# Altium footprint library TranDangKhoa-LIB.PcbLib: 1435 footprints (part 54 of 90)
Each footprint in its own frame and in the unit in brackets; x right, y up, seen from the top. Pads: shape width x height; smd on the part's side, far side on the other; paste and mask are expansions set on the pad; w line width, h text height; cw(c..) or ccw(c..) is an arc to the next point about the centre after c.
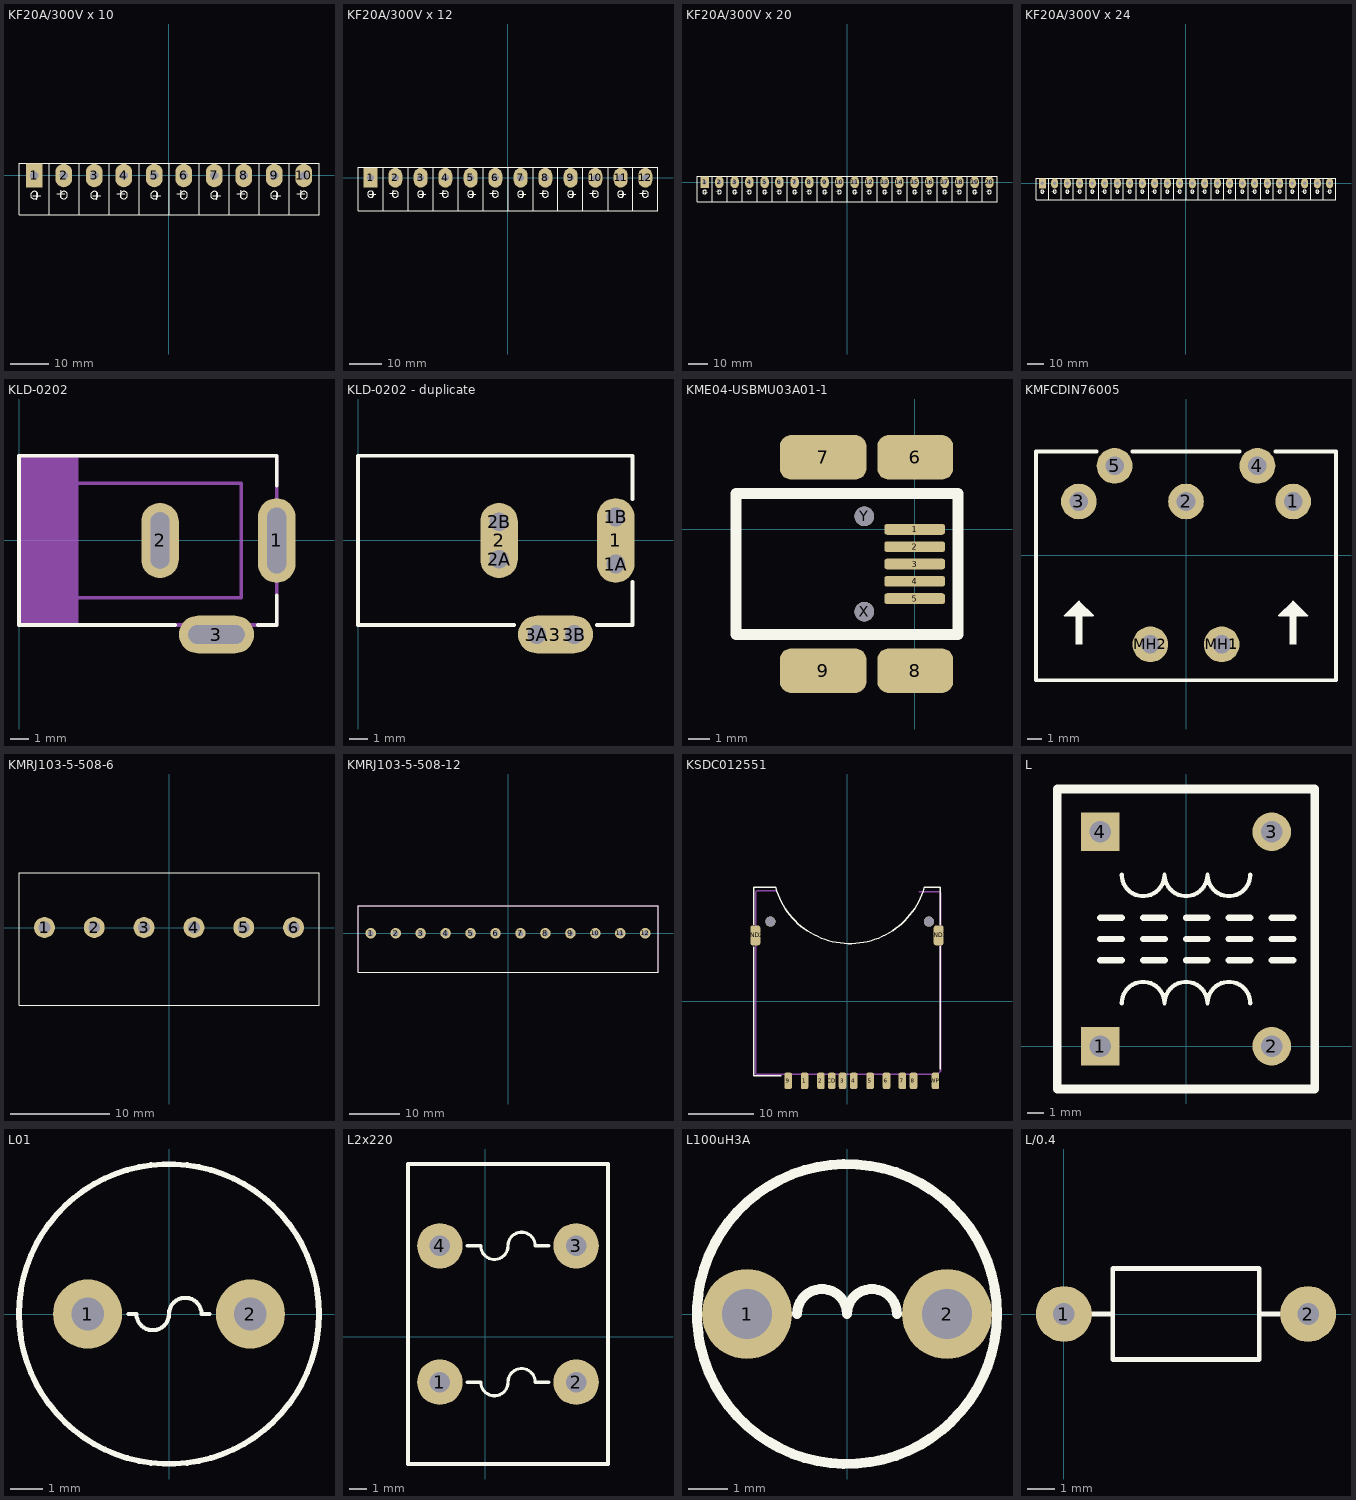
[diagram p53: the footprints below, top view; thin cyan lines are the x and y axes]

## KF20A/300V x 10 [mil] "Jac nguon 220V 20A XANH"
height 216.54
pads (10):
  rect 170x240 hole 85: 1(-1370.47,0)
  oval 170x240 hole 85: 2(-1070.47,0) 3(-760.24,0) 4(-460.24,0) 5(-150,0) 6(150,0) 7(460.24,0) 8(760.24,0) 9(1070.47,0) 10(1370.47,0)
Top Overlay:
  circle w8: c-1070.47,-200 r38.08
  circle w8: c-1370.47,-200 r38.08
  circle w8: c-760.24,-200 r38.08
  circle w8: c-460.24,-200 r38.08
  circle w8: c150,-200 r38.08
  circle w8: c-150,-200 r38.08
  circle w8: c760.24,-200 r38.08
  circle w8: c460.24,-200 r38.08
  circle w8: c1370.47,-200 r38.08
  circle w8: c1070.47,-200 r38.08
  lines w10: -1220.47,-400 -1220.47,125 ; -610.24,-400 -610.24,125 ; 0,-400 0,125 ; 610.24,-400 610.24,125 ; 1220.47,-400 1220.47,125
  lines w11.81: -915.35,-400 -1525.59,-400 -1525.59,125 -915.35,125 ; -915.35,-400 -915.35,125 ; -915.35,-400 -915.35,125 ; -915.35,-400 -305.12,-400 ; -915.35,125 -305.12,125 ; -305.12,-400 -305.12,125 ; -305.12,-400 305.12,-400 ; -305.12,-400 -305.12,125 ; -305.12,125 305.12,125 ; 305.12,-400 305.12,125 ; 305.12,-400 915.35,-400 ; 305.12,-400 305.12,125 ; 305.12,125 915.35,125 ; 915.35,-400 915.35,125 ; 915.35,-400 1525.59,-400 ; 915.35,-400 915.35,125 ; 915.35,125 1525.59,125 ; 1525.59,-400 1525.59,125 ; 1525.59,-400 1525.59,125
  text "+" at -1037.47,-150 h100
  text "+" at -1403.47,-250 h100
  text "+" at -793.24,-250 h100
  text "+" at -427.24,-150 h100
  text "+" at 183,-150 h100
  text "+" at -183,-250 h100
  text "+" at 793.24,-150 h100
  text "+" at 427.24,-250 h100
  text "+" at 1403.47,-150 h100
  text "+" at 1037.47,-250 h100

## KF20A/300V x 12 [mil] "Jac nguon 220V 20A XANH"
height 216.54
pads (12):
  rect 170x240 hole 85: 1(-1675.59,0)
  oval 170x240 hole 85: 2(-1375.59,0) 3(-1065.35,0) 4(-765.35,0) 5(-455.12,0) 6(-155.12,0) 7(155.12,0) 8(455.12,0) 9(765.35,0) 10(1065.35,0) 11(1375.59,0) 12(1675.59,0)
Top Overlay:
  circle w8: c-1375.59,-200 r38.08
  circle w8: c-1675.59,-200 r38.08
  circle w8: c-1065.35,-200 r38.08
  circle w8: c-765.35,-200 r38.08
  circle w8: c-155.12,-200 r38.08
  circle w8: c-455.12,-200 r38.08
  circle w8: c455.12,-200 r38.08
  circle w8: c155.12,-200 r38.08
  circle w8: c1065.35,-200 r38.08
  circle w8: c765.35,-200 r38.08
  circle w8: c1675.59,-200 r38.08
  circle w8: c1375.59,-200 r38.08
  lines w10: -1525.59,-400 -1525.59,125 ; -915.35,-400 -915.35,125 ; -305.12,-400 -305.12,125 ; 305.12,-400 305.12,125 ; 915.35,-400 915.35,125 ; 1525.59,-400 1525.59,125
  lines w11.81: -1220.47,-400 -1830.71,-400 -1830.71,125 -1220.47,125 ; -1220.47,-400 -1220.47,125 ; -1220.47,-400 -1220.47,125 ; -1220.47,-400 -610.24,-400 ; -1220.47,125 -610.24,125 ; -610.24,-400 -610.24,125 ; -610.24,-400 0,-400 ; -610.24,-400 -610.24,125 ; -610.24,125 0,125 ; 0,-400 0,125 ; 0,-400 610.24,-400 ; 0,-400 0,125 ; 0,125 610.24,125 ; 610.24,-400 610.24,125 ; 610.24,-400 1220.47,-400 ; 610.24,-400 610.24,125 ; 610.24,125 1220.47,125 ; 1220.47,-400 1220.47,125 ; 1220.47,-400 1830.71,-400 ; 1220.47,-400 1220.47,125 ; 1220.47,125 1830.71,125 ; 1830.71,-400 1830.71,125 ; 1830.71,-400 1830.71,125
  text "+" at -1342.59,-150 h100
  text "+" at -1708.59,-250 h100
  text "+" at -1098.35,-250 h100
  text "+" at -732.35,-150 h100
  text "+" at -122.12,-150 h100
  text "+" at -488.12,-250 h100
  text "+" at 488.12,-150 h100
  text "+" at 122.12,-250 h100
  text "+" at 1098.35,-150 h100
  text "+" at 732.35,-250 h100
  text "+" at 1708.59,-150 h100
  text "+" at 1342.59,-250 h100

## KF20A/300V x 20 [mil] "Jac nguon 220V 20A XANH"
height 216.54
pads (20):
  rect 170x240 hole 85: 1(-2896.06,0)
  oval 170x240 hole 85: 2(-2596.06,0) 3(-2285.83,0) 4(-1985.83,0) 5(-1675.59,0) 6(-1375.59,0) 7(-1065.35,0) 8(-765.35,0) 9(-455.12,0) 10(-155.12,0) 11(155.12,0) 12(455.12,0) 13(765.35,0) 14(1065.35,0) 15(1375.59,0) 16(1675.59,0) 17(1985.83,0) 18(2285.83,0) 19(2596.06,0) 20(2896.06,0)
Top Overlay:
  circle w8: c2596.06,-200 r38.08
  circle w8: c2896.06,-200 r38.08
  circle w8: c1985.83,-200 r38.08
  circle w8: c2285.83,-200 r38.08
  circle w8: c1375.59,-200 r38.08
  circle w8: c1675.59,-200 r38.08
  circle w8: c765.35,-200 r38.08
  circle w8: c1065.35,-200 r38.08
  circle w8: c155.12,-200 r38.08
  circle w8: c455.12,-200 r38.08
  circle w8: c-455.12,-200 r38.08
  circle w8: c-155.12,-200 r38.08
  circle w8: c-1065.35,-200 r38.08
  circle w8: c-765.35,-200 r38.08
  circle w8: c-1675.59,-200 r38.08
  circle w8: c-1375.59,-200 r38.08
  circle w8: c-1985.83,-200 r38.08
  circle w8: c-2285.83,-200 r38.08
  circle w8: c-2896.06,-200 r38.08
  circle w8: c-2596.06,-200 r38.08
  lines w10: -2746.06,-400 -2746.06,125 ; -2135.83,-400 -2135.83,125 ; -1525.59,-400 -1525.59,125 ; -915.35,-400 -915.35,125 ; -305.12,-400 -305.12,125 ; 305.12,-400 305.12,125 ; 915.35,-400 915.35,125 ; 1525.59,-400 1525.59,125 ; 2135.83,-400 2135.83,125 ; 2746.06,-400 2746.06,125
  lines w11.81: -2440.94,-400 -1830.71,-400 ; -2440.94,-400 -2440.94,125 ; -2440.94,-400 -2440.94,125 ; -2440.94,-400 -3051.18,-400 -3051.18,125 -2440.94,125 ; -2440.94,125 -1830.71,125 ; -1830.71,-400 -1830.71,125 ; -1830.71,-400 -1220.47,-400 ; -1830.71,-400 -1830.71,125 ; -1830.71,125 -1220.47,125 ; -1220.47,-400 -1220.47,125 ; -1220.47,-400 -610.24,-400 ; -1220.47,-400 -1220.47,125 ; -1220.47,125 -610.24,125 ; -610.24,-400 -610.24,125 ; -610.24,-400 0,-400 ; -610.24,-400 -610.24,125 ; -610.24,125 0,125 ; 0,-400 0,125 ; 0,-400 610.24,-400 ; 0,-400 0,125 ; 0,125 610.24,125 ; 610.24,-400 610.24,125 ; 610.24,-400 1220.47,-400 ; 610.24,-400 610.24,125 ; 610.24,125 1220.47,125 ; 1220.47,-400 1220.47,125 ; 1220.47,-400 1830.71,-400 ; 1220.47,-400 1220.47,125 ; 1220.47,125 1830.71,125 ; 1830.71,-400 1830.71,125 ; 1830.71,-400 2440.94,-400 ; 1830.71,-400 1830.71,125 ; 1830.71,125 2440.94,125 ; 2440.94,-400 2440.94,125 ; 2440.94,-400 3051.18,-400 3051.18,125 2440.94,125 ; 2440.94,-400 2440.94,125
  text "+" at 2563.06,-250 h100
  text "+" at 2929.06,-150 h100
  text "+" at 1952.83,-250 h100
  text "+" at 2318.83,-150 h100
  text "+" at 1342.59,-250 h100
  text "+" at 1708.59,-150 h100
  text "+" at 732.35,-250 h100
  text "+" at 1098.35,-150 h100
  text "+" at 122.12,-250 h100
  text "+" at 488.12,-150 h100
  text "+" at -488.12,-250 h100
  text "+" at -122.12,-150 h100
  text "+" at -1098.35,-250 h100
  text "+" at -732.35,-150 h100
  text "+" at -1708.59,-250 h100
  text "+" at -1342.59,-150 h100
  text "+" at -1952.83,-150 h100
  text "+" at -2318.83,-250 h100
  text "+" at -2929.06,-250 h100
  text "+" at -2563.06,-150 h100

## KF20A/300V x 24 [mil] "Jac nguon 220V 20A"
pads (24):
  rect 170x240 hole 85: 1(-3506.3,0)
  oval 170x240 hole 85: 2(-3206.3,0) 3(-2896.06,0) 4(-2596.06,0) 5(-2285.83,0) 6(-1985.83,0) 7(-1675.59,0) 8(-1375.59,0) 9(-1065.35,0) 10(-765.35,0) 11(-455.12,0) 12(-155.12,0) 13(155.12,0) 14(455.12,0) 15(765.35,0) 16(1065.35,0) 17(1375.59,0) 18(1675.59,0) 19(1985.83,0) 20(2285.83,0) 21(2596.06,0) 22(2896.06,0) 23(3206.3,0) 24(3506.3,0)
Top Overlay:
  circle w8: c2596.06,-200 r38.08
  circle w8: c2896.06,-200 r38.08
  circle w8: c-3206.3,-200 r38.08
  circle w8: c-3506.3,-200 r38.08
  circle w8: c-2896.06,-200 r38.08
  circle w8: c-2596.06,-200 r38.08
  circle w8: c-1985.83,-200 r38.08
  circle w8: c-2285.83,-200 r38.08
  circle w8: c-1375.59,-200 r38.08
  circle w8: c-1675.59,-200 r38.08
  circle w8: c-765.35,-200 r38.08
  circle w8: c-1065.35,-200 r38.08
  circle w8: c-155.12,-200 r38.08
  circle w8: c-455.12,-200 r38.08
  circle w8: c455.12,-200 r38.08
  circle w8: c155.12,-200 r38.08
  circle w8: c1065.35,-200 r38.08
  circle w8: c765.35,-200 r38.08
  circle w8: c1675.59,-200 r38.08
  circle w8: c1375.59,-200 r38.08
  circle w8: c2285.83,-200 r38.08
  circle w8: c1985.83,-200 r38.08
  circle w8: c3506.3,-200 r38.08
  circle w8: c3206.3,-200 r38.08
  lines w10: -3356.3,-400 -3356.3,125 ; -2746.06,-400 -2746.06,125 ; -2135.83,-400 -2135.83,125 ; -1525.59,-400 -1525.59,125 ; -915.35,-400 -915.35,125 ; -305.12,-400 -305.12,125 ; 305.12,-400 305.12,125 ; 915.35,-400 915.35,125 ; 1525.59,-400 1525.59,125 ; 2135.83,-400 2135.83,125 ; 2746.06,-400 2746.06,125 ; 3356.3,-400 3356.3,125
  lines w11.81: -3051.18,-400 -3661.42,-400 -3661.42,125 -3051.18,125 ; -3051.18,-400 -3051.18,125 ; -3051.18,-400 -3051.18,125 ; -3051.18,-400 -2440.94,-400 ; -3051.18,125 -2440.94,125 ; -2440.94,-400 -2440.94,125 ; -2440.94,-400 -1830.71,-400 ; -2440.94,-400 -2440.94,125 ; -2440.94,125 -1830.71,125 ; -1830.71,-400 -1830.71,125 ; -1830.71,-400 -1220.47,-400 ; -1830.71,-400 -1830.71,125 ; -1830.71,125 -1220.47,125 ; -1220.47,-400 -1220.47,125 ; -1220.47,-400 -610.24,-400 ; -1220.47,-400 -1220.47,125 ; -1220.47,125 -610.24,125 ; -610.24,-400 -610.24,125 ; -610.24,-400 0,-400 ; -610.24,-400 -610.24,125 ; -610.24,125 0,125 ; 0,-400 0,125 ; 0,-400 610.24,-400 ; 0,-400 0,125 ; 0,125 610.24,125 ; 610.24,-400 610.24,125 ; 610.24,-400 1220.47,-400 ; 610.24,-400 610.24,125 ; 610.24,125 1220.47,125 ; 1220.47,-400 1220.47,125 ; 1220.47,-400 1830.71,-400 ; 1220.47,-400 1220.47,125 ; 1220.47,125 1830.71,125 ; 1830.71,-400 1830.71,125 ; 1830.71,-400 2440.94,-400 ; 1830.71,-400 1830.71,125 ; 1830.71,125 2440.94,125 ; 2440.94,-400 3051.18,-400 ; 2440.94,-400 2440.94,125 ; 2440.94,-400 2440.94,125 ; 2440.94,125 3051.18,125 ; 3051.18,-400 3051.18,125 ; 3051.18,-400 3051.18,125 ; 3051.18,-400 3661.42,-400 3661.42,125 3051.18,125
  text "+" at 2563.06,-250 h100
  text "+" at 2929.06,-150 h100
  text "+" at -3173.3,-150 h100
  text "+" at -3539.3,-250 h100
  text "+" at -2929.06,-250 h100
  text "+" at -2563.06,-150 h100
  text "+" at -1952.83,-150 h100
  text "+" at -2318.83,-250 h100
  text "+" at -1342.59,-150 h100
  text "+" at -1708.59,-250 h100
  text "+" at -732.35,-150 h100
  text "+" at -1098.35,-250 h100
  text "+" at -122.12,-150 h100
  text "+" at -488.12,-250 h100
  text "+" at 488.12,-150 h100
  text "+" at 122.12,-250 h100
  text "+" at 1098.35,-150 h100
  text "+" at 732.35,-250 h100
  text "+" at 1708.59,-150 h100
  text "+" at 1342.59,-250 h100
  text "+" at 2318.83,-150 h100
  text "+" at 1952.83,-250 h100
  text "+" at 3539.3,-150 h100
  text "+" at 3173.3,-250 h100

## KLD-0202 [mm]
pads (3):
  oval 2x4.5 hole 1 slot 3.5 at 90 deg: 1(13.7,0)
  oval 2x4 hole 1 slot 3 at 90 deg: 2(7.5,0)
  oval 4x2 hole 1 slot 3 at 0 deg: 3(10.5,-5)
Top Overlay:
  lines w0.2: 8.3,-4.5 0,-4.5 0,4.5 13.7,4.5 13.7,2.917 ; 12.7,-4.5 13.7,-4.5 13.7,-2.917
Mechanical 7:
  rectangle: 0,-4.5 3.175,4.5
  lines w0.2: 0,-3.048 11.811,-3.048 11.811,3.048 0,3.048 ; 0,-4.5 12.7,-4.5 13.7,-4.5 13.7,4.5 0,4.5 0,-4.5
  lines w1: 7.5,-1 7.5,1 ; 9.5,-5 11.5,-5 ; 13.7,-1.2 13.7,1.2
3D body "Power Jack - TSH-3655-PBT-T.stp": height 11, standoff -3.5, extent -0.149,-5.004 14.351,4.496

## KLD-0202 - duplicate [mm] "PCB Mount DC Power Jack with 2.1mm or 2.5mm center pin"
height 10.8
pads (9):
  oval 2x4.5 all layers, no hole: 1(13.7,0)
  round 1.5 hole 1: 1A(13.7,-1.25) 1B(13.7,1.25) 2A(7.5,-1) 2B(7.5,1) 3A(9.5,-5) 3B(11.5,-5)
  oval 2x4 all layers, no hole: 2(7.5,0)
  oval 4x2 all layers, no hole: 3(10.5,-5)
Top Overlay:
  lines w0.2: 8.3,-4.5 0,-4.5 0,4.5 14.6,4.5 14.6,2.2 ; 12.7,-4.5 14.6,-4.5 14.6,-2.2
Mechanical 2:
  lines w1: 7.5,-1 7.5,1 ; 9.5,-5 11.5,-5 ; 13.7,-1.25 13.7,1.25

## KME04-USBMU03A01-1 [mm]
pads (11):
  rrect50% 2.8x0.5 smd: 1(0,0) 2(0,-0.8) 3(0,-1.6) 4(0,-2.4) 5(0,-3.2)
  rrect50% 3.5x2.05 smd: 6(0.025,3.325) 8(0.025,-6.525)
  rrect50% 4x2.05 smd: 7(-4.225,3.325) 9(-4.225,-6.525)
  round 0.9 hole 0.9 unplated: X(-2.325,-3.8) Y(-2.325,0.6)
Top Overlay:
  lines w0.5: -8.25,-4.85 2,-4.85 2,1.65 -8.25,1.65 -8.25,-4.85
3D body "USB Mini B - Connector.stp": height 3.95, standoff -1, extent -8.217,-6.557 0.783,3.343

## KMFCDIN76005 [mm]
pads (7):
  round 2.5 hole 1.3: 1(7.5,3.75) 2(0,3.75) 3(-7.5,3.75) 4(5,6.25) 5(-5,6.25) MH1(2.5,-6.25) MH2(-2.5,-6.25)
Top Overlay:
  region: 7.75,-4.25 7.25,-4.25 7.25,-6.25 7.75,-6.25
  rectangle: -7.75,-6.25 -7.25,-4.25
  region: 8.5,-4.25 7.5,-3.25 6.5,-4.25
  region: -8.5,-4.25 -7.5,-3.25 -6.5,-4.25
  lines w0.127: -8.5,-4.25 -6.5,-4.25 -7.5,-3.25 -8.5,-4.25 ; 6.5,-4.25 8.5,-4.25 7.5,-3.25 6.5,-4.25
  lines w0.254: -6.25,7.25 -10.5,7.25 -10.5,-8.75 10.5,-8.75 10.5,7.25 6.25,7.25 ; -3.75,7.25 3.75,7.25
3D body "pin.stp": height 12.87, standoff -2.91, extent 0.427,5.764 5.72,7.313
3D body "5PINDIN.STEP": height 21.4, standoff -3.5, extent -10.34,-8.95 10.36,6.05
3D body "pin.stp": height 12.87, standoff -2.91, extent -5.72,5.087 -0.428,6.636
3D body: height 13.2, standoff 12, extent -0.89,4.62 -0.359,6.72
3D body: height 13.2, standoff 12, extent 0.39,4.64 0.921,6.74

## KMRJ103-5-508-6 [mm]
pads (6):
  round 2.1 hole 1.2: 1(-12.5,0) 2(-7.5,0) 3(-2.5,0) 4(2.5,0) 5(7.5,0) 6(12.5,0)
Top Overlay:
  lines w0.1: -15.05,-7.8 -15.05,5.5 15.05,5.5 15.05,-7.8 -15.05,-7.8
3D body "60s35.stp": height 15.3, standoff -3.5, extent -15.835,-6.404 14.906,6.996

## KMRJ103-5-508-12 [mm]
pads (12):
  round 2.1 hole 1.2: 1(-27.5,0) 2(-22.5,0) 3(-17.5,0) 4(-12.5,0) 5(-7.5,0) 6(-2.5,0) 7(2.5,0) 8(7.5,0) 9(12.5,0) 10(17.5,0) 11(22.5,0) 12(27.5,0)
Top Overlay:
  lines w0.1: -30.05,-7.8 30.05,-7.8 30.05,5.5 -30.05,5.5 -30.05,-7.8
Mechanical 13:
  lines w0.1: -30.05,-7.8 30.05,-7.8 30.05,5.5 -30.05,5.5 -30.05,-7.8
3D body "12pos35.stp": height 15.3, standoff -3.5, extent -30.701,-6.401 30.04,6.999

## KSDC012551 [mm]
pads (15):
  rrect50% 1.16x2.5 smd: 1(-6.48,-12.15) 2(-3.98,-12.15) 3(-0.68,-12.15) 4(1.03,-12.15) 5(3.53,-12.15) 6(6.03,-12.15) 7(8.45,-12.15) 8(10.15,-12.15) 9(-8.98,-12.15) CD(-2.33,-12.15) WP(13.5,-12.15)
  rrect50% 1.524x3.048 smd: GND1(14,10.05) GND2(-14,10.05)
  round 1.55 hole 1.55 unplated: MH1(12.5,12.15) MH2(-11.7,12.15)
Top Overlay:
  lines w0.2: -14.22,8.3 -14.22,-11.4 -10,-11.4 ; -14.22,11.7 -14.22,17.391 -14.216,17.396 -10.915,17.396 ccw(c0.441,20.6) 11.799,17.4 14.22,17.4 14.22,11.7 ; 14.22,-10.4 14.22,8.4
Mechanical 1:
  lines w0.254: -13.848,-11.146 13.813,-11.146
Mechanical 13:
  lines w0.254: -13.919,-11.024 -13.919,16.662 -13.716,16.866 -10.871,16.866 ; 11.024,16.739 14.122,16.739 14.275,16.586 14.275,-10.684 13.813,-11.146
3D body: height 2.38, standoff 0, extent 13.105,-12.426 13.303,-11.468
3D body: height 2.4, standoff 2, extent 13.108,-12.426 13.299,-9.243
3D body: height 2.4, standoff 2, extent 9.826,-11.996 10.419,-8.813
3D body: height 2.38, standoff 0, extent 9.826,-11.996 10.419,-11.375
3D body: height 0.3, standoff 0, extent 9.831,-12.476 10.419,-11.558
3D body: height 2.4, standoff 2, extent 8.189,-11.996 8.782,-8.813
3D body: height 2.38, standoff 0, extent 8.189,-11.996 8.782,-11.375
3D body: height 0.3, standoff 0, extent 8.194,-12.476 8.782,-11.558
3D body: height 2.4, standoff 2, extent 5.726,-12.055 6.319,-8.872
3D body: height 2.38, standoff 0, extent 5.726,-12.055 6.319,-11.434
3D body: height 0.3, standoff 0, extent 5.731,-12.535 6.319,-11.617
3D body: height 2.4, standoff 2, extent 3.174,-12.055 3.767,-8.872
3D body: height 2.38, standoff 0, extent 3.174,-12.055 3.767,-11.434
3D body: height 0.3, standoff 0, extent 3.179,-12.535 3.767,-11.617
3D body: height 2.4, standoff 2, extent 0.741,-12.084 1.334,-8.901
3D body: height 2.38, standoff 0, extent 0.741,-12.084 1.334,-11.463
3D body: height 0.3, standoff 0, extent 0.746,-12.564 1.334,-11.646
3D body: height 2.4, standoff 2, extent -0.941,-12.099 -0.348,-8.916
3D body: height 2.38, standoff 0, extent -0.941,-12.099 -0.348,-11.478
3D body: height 0.3, standoff 0, extent -0.936,-12.579 -0.348,-11.661
3D body: height 2.4, standoff 2, extent -2.578,-12.261 -1.985,-9.078
3D body: height 2.38, standoff 0, extent -2.578,-12.261 -1.985,-11.64
3D body: height 0.3, standoff 0, extent -2.573,-12.741 -1.985,-11.823
3D body: height 2.4, standoff 2, extent -4.274,-12.114 -3.681,-8.931
3D body: height 2.38, standoff 0, extent -4.274,-12.114 -3.681,-11.493
3D body: height 0.3, standoff 0, extent -4.269,-12.594 -3.681,-11.676
3D body: height 2.4, standoff 2, extent -6.737,-12.158 -6.144,-8.975
3D body: height 2.38, standoff 0, extent -6.737,-12.158 -6.144,-11.537
3D body: height 0.3, standoff 0, extent -6.732,-12.638 -6.144,-11.72
3D body: height 2.8, standoff 0, extent 13.997,-9.117 14.222,-8.169
3D body: height 2.8, standoff 0, extent -14.316,9.408 -14,10.435
3D body: height 2.8, standoff 0, extent 13.79,8.869 14.214,11.321
3D body: height 2, standoff 0, extent -13.854,7.771 -13.597,16.285
3D body: height 2.9, standoff 0, extent -13.864,-11.131 -13.459,7.804
3D body: height 2.9, standoff 0, extent -6.383,-11.215 -1.965,-9.929
3D body: height 2.9, standoff 0, extent 1.13,-11.166 4.663,-9.85
3D body: height 2.9, standoff 0, extent 8.812,-11.288 13.049,-9.658
3D body: height 2.8, standoff 0, extent -13.519,-11.146 13.951,-10.009
3D body: height 2, standoff 0.3, extent 13.952,-8.17 14.319,16.403
3D body: height 0.3, standoff 0, extent -9.258,-12.602 -8.67,-11.684
3D body: height 2.38, standoff 0, extent -9.263,-12.122 -8.67,-11.501
3D body: height 2.4, standoff 2, extent -9.263,-12.122 -8.67,-8.939
3D body: height 0.3, standoff 0, extent 13.108,-12.406 13.954,-11.463
3D body "SD card.stp": height 2.23, standoff 0.13, extent -12.088,-10.471 11.912,21.529
3D body: height 0.89, standoff 0.03, extent -13.959,-11.026 14.159,16.685
3D body: height 2.9, standoff 2.59, extent -13.97,-10.871 14.402,17.018

## L [mil] "Cuon loc nguon 220V 0.8mA"
height 209.84
pads (4):
  rect 90x90 hole 50: 1(-200,0) 4(-200,500)
  round 90 hole 50: 2(200,0) 3(200,500)
Top Overlay:
  lines w10: -150,100 cw(c-100,100) -50,100 cw(c0,100) 50,100 cw(c100,100) 150,100 ; -150,400 ccw(c-100,400) -50,400 ccw(c0,400) 50,400 ccw(c100,400) 150,400
  lines w15: -200,200 -150,200 ; -200,250 -150,250 ; -200,300 -150,300 ; -100,200 -50,200 ; -100,250 -50,250 ; -100,300 -50,300 ; 0,200 50,200 ; 0,250 50,250 ; 0,300 50,300 ; 100,200 150,200 ; 100,250 150,250 ; 100,300 150,300 ; 200,200 250,200 ; 200,250 250,250 ; 200,300 250,300
  lines w20: -300,-100 300,-100 300,600 -300,600 -300,-100

## L01 [mil] "Inductor"
pads (2):
  round 85 hole 40: 1(-100,0) 2(100,0)
Top Overlay:
  circle w7: c0,0 r184.39
  lines w5: -50,0 -40,0 ccw(c-20,0) 0,0 cw(c20,0) 40,0 50,0

## L2x220 [mil] "Loc 220"
pads (4):
  round 100 hole 45: 1(-100,-100) 2(200,-100) 3(200,200) 4(-100,200)
Top Overlay:
  lines w7: -10,-100 ccw(c20,-100) 50,-100 cw(c80,-100) 110,-100 ; -10,200 ccw(c20,200) 50,200 cw(c80,200) 110,200
  lines w8: -40,-100 -10,-100 ; -40,200 -10,200 ; 110,-100 140,-100 ; 110,200 140,200 ; -170,-280 270,-280 270,380 -170,380 -170,-280

## L100uH3A [mil] "100uH3A"
pads (2):
  round 90 hole 50: 1(-100,0) 2(100,0)
Top Overlay:
  circle w10: c0,0 r150
  lines w10: -50,0 cw(c-25,0) 0,0 cw(c25,0) 50,0

## L/0.4 [mil] "Inductor , 2 Pin, L 350mil, W 150 mil"
height 150
pads (2):
  round 80 hole 31: 1(0,0) 2(350,0)
Top Overlay:
  lines w7: 70,0 40,0 70,0 ; 70,0 70,-65 280,-65 280,0 ; 70,0 70,65 280,65 280,0 ; 280,0 310,0 280,0